# Altium footprint library WTR-PCB_LIB.PcbLib: 56 footprints (part 3 of 4)
Each footprint in its own frame and in the unit in brackets; x right, y up, seen from the top. Pads: shape width x height; smd on the part's side, far side on the other; paste and mask are expansions set on the pad; w line width, h text height; cw(c..) or ccw(c..) is an arc to the next point about the centre after c.
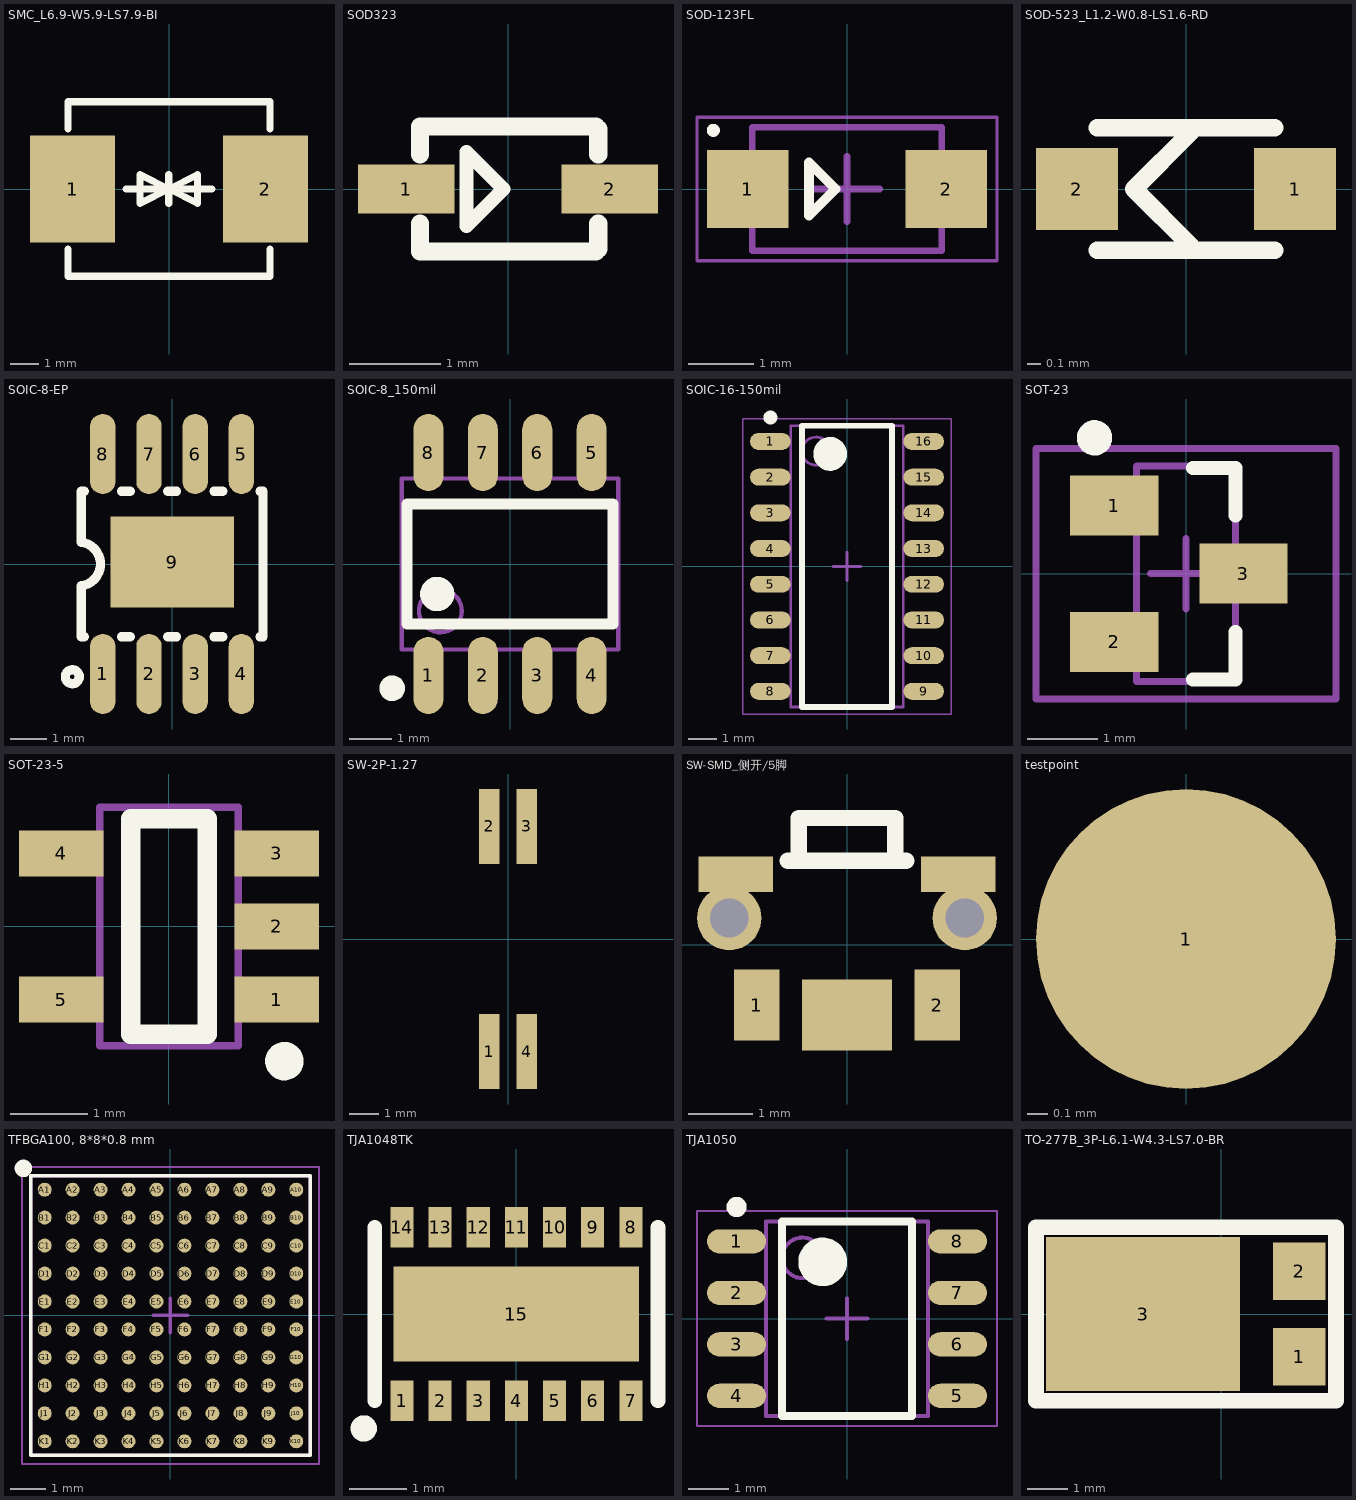
[diagram p2: the footprints below, top view; thin cyan lines are the x and y axes]

## SMC_L6.9-W5.9-LS7.9-BI [mm]
pads (2):
  rect 3.03x3.82 smd: 1(-3.435,0) 2(3.435,0)
Top Overlay:
  lines w0.254: -3.6,-2.141 -3.6,-3.11 3.6,-3.11 3.6,-2.141 ; -3.6,2.141 -3.6,3.11 3.6,3.11 3.6,2.141 ; -1.536,0 0.496,0 ; -0.508,0 1.524,0 ; -0.012,-0.508 -0.012,0.508 -0.012,0 ; 0,0.508 0,-0.508 0,0 ; -0.012,0 -1.028,-0.508 -1.028,0.508 -0.012,0 ; 0,0 1.016,-0.508 1.016,0.508 0,0

## SOD323 [mm]
pads (2):
  rect 1.06x0.54 smd: 1(-1.118,0) 2(1.118,0)
Top Overlay:
  lines w0.152: -0.457,-0.406 -0.051,0 -0.457,0.406 -0.457,-0.406
  lines w0.2: -0.965,-0.381 -0.965,-0.686 0.965,-0.686 ; -0.965,0.381 -0.965,0.686 0.965,0.686 ; 0.991,-0.66 0.991,-0.381 ; 0.991,0.381 0.991,0.66
3D body "User Library-SOD2513X11.STEP": height 1.1, standoff 0, extent -1.35,-0.615 1.35,0.635

## SOD-123FL [mm] "SODFL, 2-Leads, Body 1.80x3.70mm, IPC Medium Density"
height 1.1
pads (2):
  rect 1.25x1.2 smd: 1(-1.525,0) 2(1.525,0)
Top Overlay:
  circle w0.1: c-2.05,0.9 r0.05
  lines w0.152: -0.584,-0.406 -0.178,0 -0.584,0.406 -0.584,-0.406
Top Assembly:
  lines w0.1: -1.45,-0.95 1.45,-0.95 1.45,0.95 -1.45,0.95 -1.45,-0.95
Top Courtyard:
  lines w0.05: -2.3,-1.1 2.3,-1.1 2.3,1.1 -2.3,1.1 -2.3,-1.1
  lines w0.1: -0.5,0 0.5,0 ; 0,-0.5 0,0.5
3D body: height 1.1, standoff 0, extent -1.45,-0.95 1.45,0.95

## SOD-523_L1.2-W0.8-LS1.6-RD [mm]
pads (2):
  rect 0.6x0.6 smd: 1(0.8,0) 2(-0.8,0)
Top Overlay:
  lines w0.13: -0.65,-0.45 0.65,-0.45 ; -0.65,0.45 0.65,0.45 ; 0.035,-0.416 -0.381,0 0.035,0.416

## SOIC-8-EP [mm]
pads (9):
  oval 0.7x2.2 smd: 1(-1.905,-3.023) 2(-0.635,-3.023) 3(0.635,-3.023) 4(1.905,-3.023) 5(1.905,3.023) 6(0.635,3.023) 7(-0.635,3.023) 8(-1.905,3.023)
  rect 3.4x2.5 smd: 9(0,0.051)
Top Overlay:
  circle w0.254: c-2.743,-3.099 r0.191
  lines w0.254: -2.418,-2 -2.5,-2 -2.5,-0.6 ccw(c-2.572,0) -2.499,0.599 -2.5,2 -2.418,2 ; -1.392,-2 -1.148,-2 ; -1.392,2 -1.148,2 ; -0.122,-2 0.122,-2 ; -0.122,2 0.122,2 ; 1.148,-2 1.392,-2 ; 1.148,2 1.392,2 ; 2.418,-2 2.5,-2 2.5,2 2.418,2

## SOIC-8_150mil [mm]
height 1.3
pads (8):
  oval 0.7x1.8 smd: 1(-1.905,-2.6) 2(-0.635,-2.6) 3(0.635,-2.6) 4(1.905,-2.6) 5(1.905,2.6) 6(0.635,2.6) 7(-0.635,2.6) 8(-1.905,2.6)
Top Overlay:
  circle w0.3: c-2.75,-2.9 r0.15
  circle w0.4: c-1.7,-0.7 r0.2
  lines w0.254: -2.4,-1.4 2.4,-1.4 2.4,1.4 -2.4,1.4 -2.4,-1.4
Mechanical 13:
  circle w0.1: c-1.625,-1.095 r0.5
  lines w0.1: -2.525,-1.995 2.525,-1.995 2.525,1.995 -2.525,1.995 -2.525,-1.995
3D body "User Library-so8-3.STEP": height 1.7, standoff 0, extent -2.45,-3 2.45,3

## SOIC-16-150mil [mm] "SOIC, 16-Leads, Body 9.90x3.90mm, Pitch 1.27mm, IPC Medium Density"
height 1.75
pads (16):
  oval 1.45x0.6 smd: 1(-2.725,4.445) 2(-2.725,3.175) 3(-2.725,1.905) 4(-2.725,0.635) 5(-2.725,-0.635) 6(-2.725,-1.905) 7(-2.725,-3.175) 8(-2.725,-4.445) 9(2.725,-4.445) 10(2.725,-3.175) 11(2.725,-1.905) 12(2.725,-0.635) 13(2.725,0.635) 14(2.725,1.905) 15(2.725,3.175) 16(2.725,4.445)
Top Overlay:
  circle w0.6: c-0.6,4 r0.3
  circle w0.25: c-2.725,5.295 r0.125
  lines w0.2: -1.6,-5 1.6,-5 1.6,5 -1.6,5 -1.6,-5
Top Assembly:
  circle w0.1: c-1.1,4.1 r0.5
  lines w0.1: -2,-5 2,-5 2,5 -2,5 -2,-5
Top Courtyard:
  lines w0.05: -3.7,-5.25 3.7,-5.25 3.7,5.25 -3.7,5.25 -3.7,-5.25
  lines w0.1: -0.5,0 0.5,0 ; 0,-0.5 0,0.5
3D body "User Library-SOIC16-150.STEP": height 1.75, standoff 0, extent -2.9,-4.9 2.9,4.9

## SOT-23 [mm]
pads (3):
  rect 1.25x0.85 smd: 1(-1.016,0.965) 2(-1.016,-0.965) 3(0.813,0)
Top Overlay:
  circle w0.25: c-1.295,1.925 r0.125
  lines w0.2: 0.1,-1.5 0.7,-1.5 0.7,-0.825 ; 0.1,1.5 0.7,1.5 0.7,0.825
Mechanical 13:
  lines w0.1: -0.7,-1.525 0.7,-1.525 0.7,1.525 -0.7,1.525 -0.7,-1.525
Mechanical 15:
  lines w0.1: -0.5,0 0.5,0 ; 0,-0.5 0,0.5 ; -2.125,-1.775 2.125,-1.775 2.125,1.775 -2.125,1.775 -2.125,-1.775
3D body "SOT-23封?": height 1.04, standoff -0.03, extent -1.124,-1.473 1.174,1.447

## SOT-23-5 [mm]
height 1.3
pads (5):
  rect 1.1x0.6 smd: 1(1.4,-0.95) 2(1.4,0) 3(1.4,0.95) 4(-1.4,0.95) 5(-1.4,-0.95)
Top Overlay:
  circle w0.25: c1.5,-1.75 r0.125
  lines w0.254: -0.5,-1.4 0.5,-1.4 0.5,1.4 -0.5,1.4 -0.5,-1.4
Mechanical 13:
  lines w0.1: -0.9,-1.55 -0.9,1.55 0.9,1.55 0.9,-1.55 -0.9,-1.55
3D body "CircuitWorks-SOT-23-5.STEP": height 1.05, standoff -0.05, extent -1.25,-1.5 1.25,1.5

## SW-2P-1.27 [mm]
pads (4):
  rect 0.7x2.54 smd: 1(-0.635,-3.815) 2(-0.635,3.815) 3(0.635,3.815) 4(0.635,-3.815)
3D body: height 0.25, standoff 0, extent -2.06,-2.7 2.06,2.7

## SW-SMD_侧开/5脚 [mm]
pads (7):
  rect 0.7x1.1 smd: 1(-1.4,-0.938) 2(1.4,-0.938)
  round 1 hole 0.6: ""(-1.825,0.412) ""(1.825,0.412)
  rect 1.15x0.55 smd: ""(-1.725,1.088) ""(1.725,1.088)
  rect 1.4x1.1 smd: ""(0,-1.088)
Top Overlay:
  lines w0.254: -0.919,1.301 0.919,1.301 ; -0.75,1.301 -0.75,1.963 0.75,1.963 0.75,1.301

## testpoint [mm]
pads (1):
  round 1.5 smd: 1(0,0)

## TFBGA100, 8*8*0.8 mm [mm] "BGA, 100-Leads, Body 8.00x8.00mmx1.10mm, Pitch 0.80mm"
height 1.1
pads (100):
  round 0.4 smd mask+0.076: A1(-3.6,3.6) A2(-2.8,3.6) A3(-2,3.6) A4(-1.2,3.6) A5(-0.4,3.6) A6(0.4,3.6) A7(1.2,3.6) A8(2,3.6) A9(2.8,3.6) A10(3.6,3.6) B1(-3.6,2.8) B2(-2.8,2.8) B3(-2,2.8) B4(-1.2,2.8) B5(-0.4,2.8) B6(0.4,2.8) B7(1.2,2.8) B8(2,2.8) B9(2.8,2.8) B10(3.6,2.8) C1(-3.6,2) C2(-2.8,2) C3(-2,2) C4(-1.2,2) C5(-0.4,2) C6(0.4,2) C7(1.2,2) C8(2,2) C9(2.8,2) C10(3.6,2) D1(-3.6,1.2) D2(-2.8,1.2) D3(-2,1.2) D4(-1.2,1.2) D5(-0.4,1.2) D6(0.4,1.2) D7(1.2,1.2) D8(2,1.2) D9(2.8,1.2) D10(3.6,1.2) E1(-3.6,0.4) E2(-2.8,0.4) E3(-2,0.4) E4(-1.2,0.4) E5(-0.4,0.4) E6(0.4,0.4) E7(1.2,0.4) E8(2,0.4) E9(2.8,0.4) E10(3.6,0.4) F1(-3.6,-0.4) F2(-2.8,-0.4) F3(-2,-0.4) F4(-1.2,-0.4) F5(-0.4,-0.4) F6(0.4,-0.4) F7(1.2,-0.4) F8(2,-0.4) F9(2.8,-0.4) F10(3.6,-0.4) G1(-3.6,-1.2) G2(-2.8,-1.2) G3(-2,-1.2) G4(-1.2,-1.2) G5(-0.4,-1.2) G6(0.4,-1.2) G7(1.2,-1.2) G8(2,-1.2) G9(2.8,-1.2) G10(3.6,-1.2) H1(-3.6,-2) H2(-2.8,-2) H3(-2,-2) H4(-1.2,-2) H5(-0.4,-2) H6(0.4,-2) H7(1.2,-2) H8(2,-2) H9(2.8,-2) H10(3.6,-2) J1(-3.6,-2.8) J2(-2.8,-2.8) J3(-2,-2.8) J4(-1.2,-2.8) J5(-0.4,-2.8) J6(0.4,-2.8) J7(1.2,-2.8) J8(2,-2.8) J9(2.8,-2.8) J10(3.6,-2.8) K1(-3.6,-3.6) K2(-2.8,-3.6) K3(-2,-3.6) K4(-1.2,-3.6) K5(-0.4,-3.6) K6(0.4,-3.6) K7(1.2,-3.6) K8(2,-3.6) K9(2.8,-3.6) K10(3.6,-3.6)
Top Overlay:
  circle w0.25: c-4.21,4.21 r0.125
  lines w0.1: -4,-4 3.999,-4 3.999,3.999 -4,3.999 -4,-4
Top Assembly:
  lines w0.1: -4,-4 -4,4 4,4 4,-4 -4,-4
Top Courtyard:
  lines w0.05: -4.25,-4.25 4.25,-4.25 4.25,4.25 -4.25,4.25 -4.25,-4.25
  lines w0.1: -0.5,0 0.5,0 ; 0,-0.5 0,0.5
3D body "User Library-TFBGA100.STEP": height 0.71, standoff -0.35, extent -4.502,-4.513 4.498,4.487

## TJA1048TK [mm] "double-can"
pads (15):
  rect 0.4x0.7 smd: 1(-1.98,-1.5) 2(-1.32,-1.5) 3(-0.66,-1.5) 4(0,-1.5) 5(0.66,-1.5) 6(1.32,-1.5) 7(1.98,-1.5) 8(1.98,1.5) 9(1.32,1.5) 10(0.66,1.5) 11(0,1.5) 12(-0.66,1.5) 13(-1.32,1.5) 14(-1.98,1.5)
  rect 4.25x1.65 smd: 15(0,0)
Top Overlay:
  circle w0.254: c-2.64,-1.98 r0.1
  lines w0.254: -2.45,-1.5 -2.45,1.5 ; 2.45,-1.5 2.45,1.5

## TJA1050 [mm] "SOIC, 8-Leads, Body 4.90x3.90mm, Pitch 1.27mm, IPC Medium Density"
height 1.75
pads (8):
  oval 1.45x0.6 smd: 1(-2.725,1.905) 2(-2.725,0.635) 3(-2.725,-0.635) 4(-2.725,-1.905) 5(2.725,-1.905) 6(2.725,-0.635) 7(2.725,0.635) 8(2.725,1.905)
Top Overlay:
  circle w0.25: c-2.725,2.755 r0.125
  circle w0.6: c-0.6,1.4 r0.3
  lines w0.2: -1.6,-2.4 -1.6,2.4 1.6,2.4 1.6,-2.4 -1.6,-2.4
Top Assembly:
  circle w0.1: c-1.1,1.5 r0.5
  lines w0.1: -2,-2.4 -2,2.4 2,2.4 2,-2.4 -2,-2.4
Top Courtyard:
  lines w0.05: -3.7,-2.65 -3.7,2.65 3.7,2.65 3.7,-2.65 -3.7,-2.65
  lines w0.1: -0.5,0 0.5,0 ; 0,-0.5 0,0.5
3D body: height 1.75, standoff 0.1, extent -2,-2.4 2,2.4

## TO-277B_3P-L6.1-W4.3-LS7.0-BR [mm]
pads (3):
  rect 1.29x1.422 smd: 1(1.933,-1.057) 2(1.933,1.057)
  rect 4.8x3.8 smd: 3(-1.933,0)
Top Overlay:
  lines w0.387: -4.583,2.15 2.834,2.15 ; -4.582,-2.15 -4.582,2.15 ; -4.575,-2.15 2.842,-2.15 2.842,2.15